# Altium footprint library 119A-92A00-R02.PcbLib: 1 footprints
Each footprint in its own frame and in the unit in brackets; x right, y up, seen from the top. Pads: shape width x height; smd on the part's side, far side on the other; paste and mask are expansions set on the pad; w line width, h text height; cw(c..) or ccw(c..) is an arc to the next point about the centre after c.
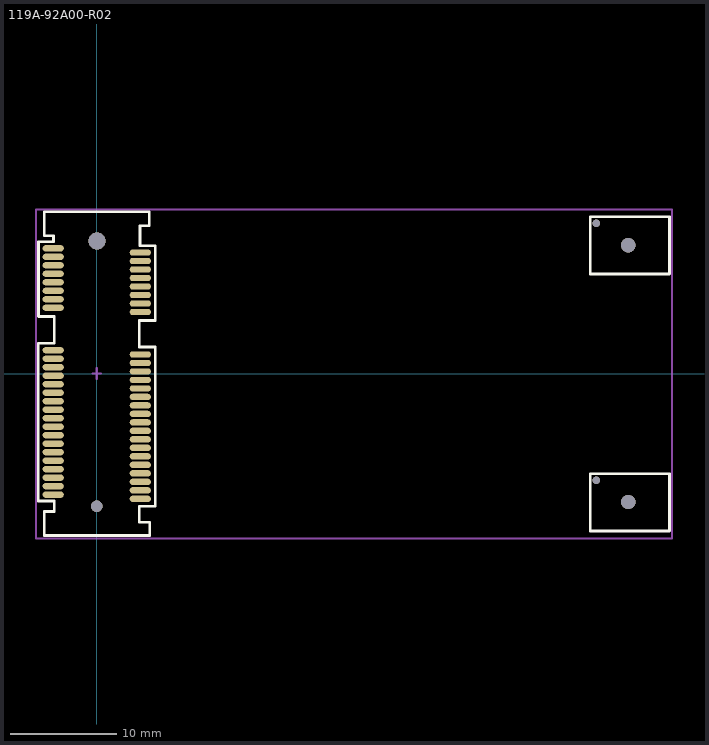
[diagram p0: the footprint, top view; thin cyan lines are the x and y axes]

## 119A-92A00-R02 [mm]
pads (52):
  oval 2x0.6 smd: 1(-4.1,11.8) 2(4.1,11.4) 3(-4.1,11) 4(4.1,10.6) 5(-4.1,10.2) 6(4.1,9.8) 7(-4.1,9.4) 8(4.1,9) 9(-4.1,8.6) 10(4.1,8.2) 11(-4.1,7.8) 12(4.1,7.4) 13(-4.1,7) 14(4.1,6.6) 15(-4.1,6.2) 16(4.1,5.8) 17(-4.1,2.2) 18(4.1,1.8) 19(-4.1,1.4) 20(4.1,1) 21(-4.1,0.6) 22(4.1,0.2) 23(-4.1,-0.2) 24(4.1,-0.6) 25(-4.1,-1) 26(4.1,-1.4) 27(-4.1,-1.8) 28(4.1,-2.2) 29(-4.1,-2.6) 30(4.1,-3) 31(-4.1,-3.4) 32(4.1,-3.8) 33(-4.1,-4.2) 34(4.1,-4.6) 35(-4.1,-5) 36(4.1,-5.4) 37(-4.1,-5.8) 38(4.1,-6.2) 39(-4.1,-6.6) 40(4.1,-7) 41(-4.1,-7.4) 42(4.1,-7.8) 43(-4.1,-8.2) 44(4.1,-8.6) 45(-4.1,-9) 46(4.1,-9.4) 47(-4.1,-9.8) 48(4.1,-10.2) 49(-4.1,-10.6) 50(4.1,-11) 51(-4.1,-11.4) 52(4.1,-11.8)
via 47.05,-10.05 diameter 0.7 hole 0.7
via 47.05,14.15 diameter 0.7 hole 0.7
via 0,-12.5 diameter 1.1 hole 1.1
via 0,12.5 diameter 1.6 hole 1.6
via 50.05,12.1 diameter 1.35 hole 1.35
via 50.05,-12.1 diameter 1.35 hole 1.35
Top Overlay:
  lines w0.254: -5.5,-12 -5.5,2.87 -4,2.87 -4,5.37 -5.49,5.37 -5.49,12.42 -4.07,12.42 -4.07,12.97 -4.95,12.97 -4.95,15.25 4.95,15.25 4.95,13.93 4.07,13.93 4.07,12.05 5.5,12.05 5.5,5 4,5 4,2.5 5.5,2.5 5.5,-12.5 4,-12.5 4,-14 5,-14 5,-15.25 -4.95,-15.25 -4.95,-13 -4,-13 -4,-12 -5.5,-12 ; 46.49,-14.83 53.94,-14.83 53.94,-9.43 46.49,-9.43 46.49,-14.83 ; 46.49,9.37 46.49,14.77 53.94,14.77 53.94,9.37 46.49,9.37
Mechanical 3:
  text "ONLY LOW COMPONENTS ALLOWED HERE" at 4.5,3 h1.52
Mechanical 13:
  lines w0.2: -5.74,-15.55 -5.74,15.47 54.2,15.47 54.2,-15.55 -5.74,-15.55
Mechanical 15:
  lines w0.2: -0.4,0 0.4,0 ; 0,-0.5 0,0.5 ; -5.74,-15.55 -5.74,15.47 54.2,15.47 54.2,-15.55 -5.74,-15.55
Mechanical 17:
  text "'.Designator'" at 19.5,1.5 h1.02
Mechanical 19:
  text "'.Comment'" at 19.5,-0.5 h1.02
3D body "pcie.step": height 10.9, standoff -0.7, extent -4.737,-15.031 53.713,14.976